# Altium footprint library My Library.PCBLIB: 198 footprints (part 3 of 13)
Each footprint in its own frame and in the unit in brackets; x right, y up, seen from the top. Pads: shape width x height; smd on the part's side, far side on the other; paste and mask are expansions set on the pad; w line width, h text height; cw(c..) or ccw(c..) is an arc to the next point about the centre after c.
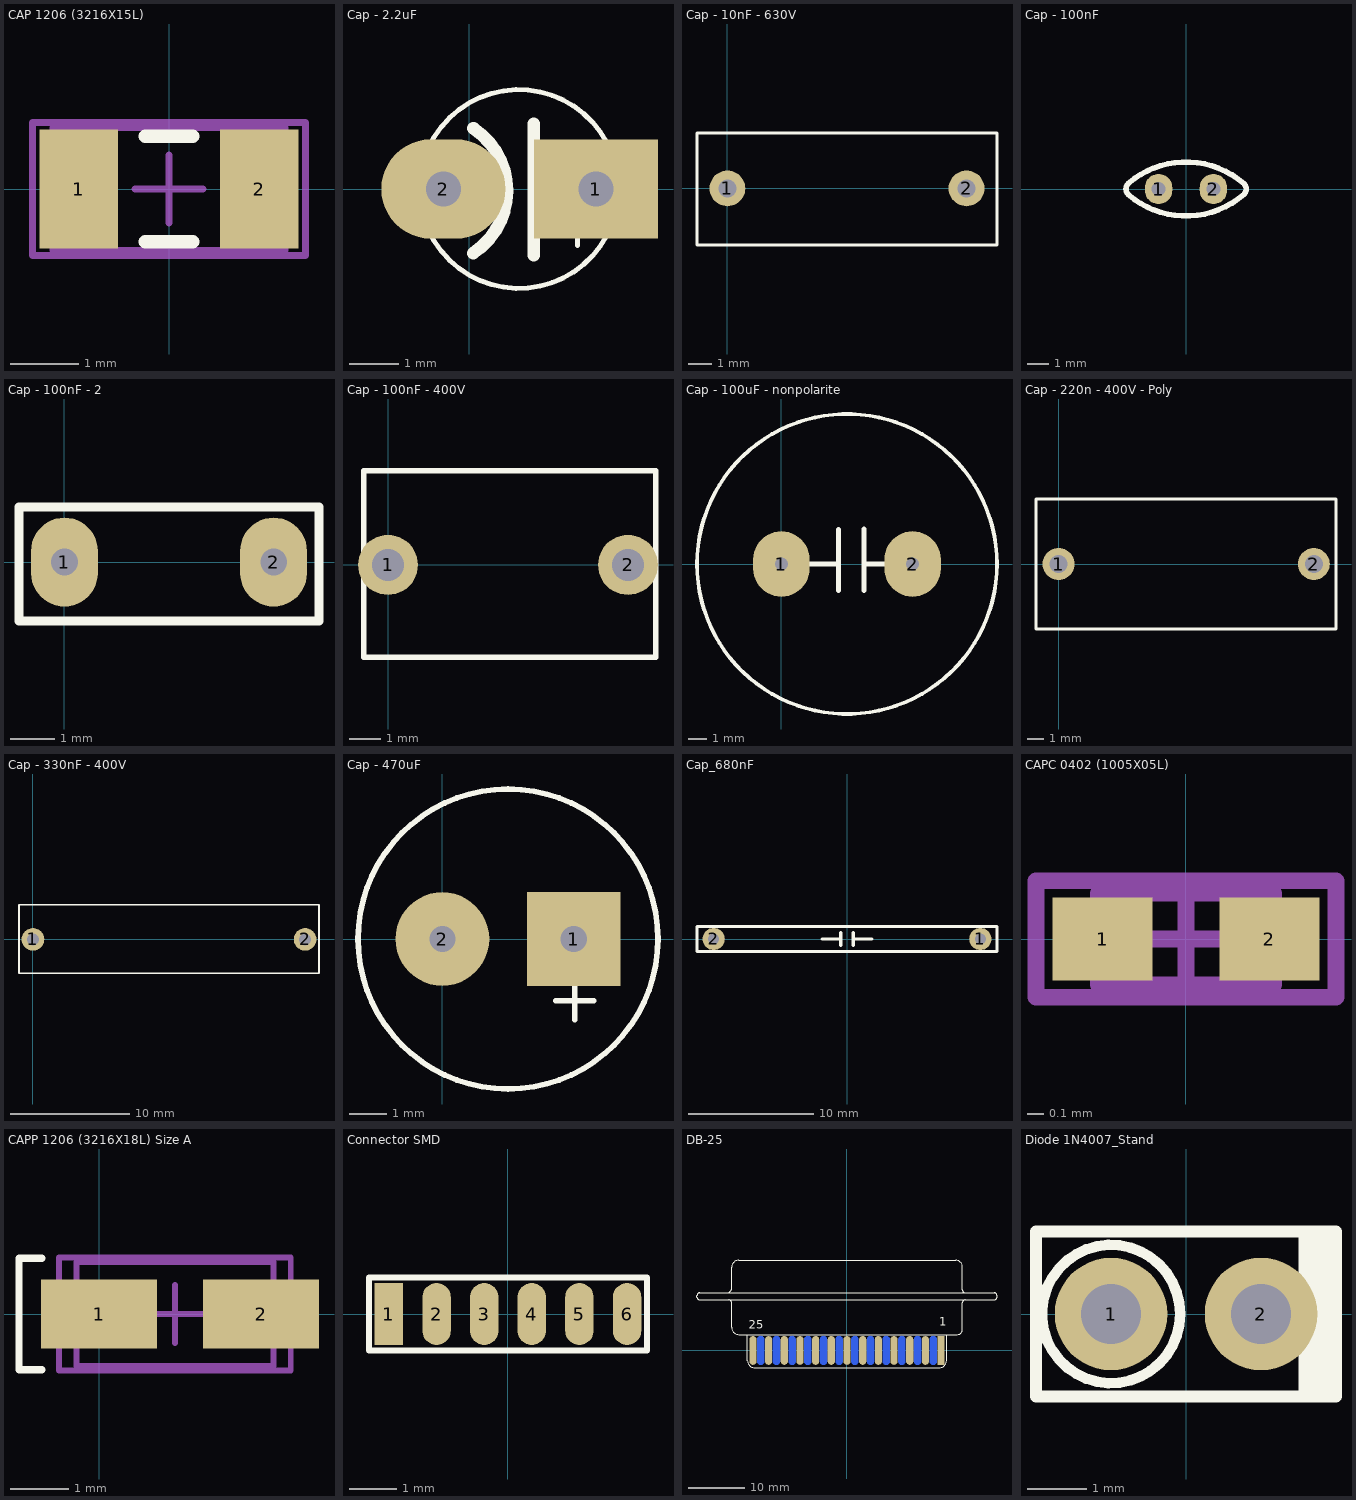
[diagram p2: the footprints below, top view; thin cyan lines are the x and y axes]

## CAP 1206 (3216X15L) [mm] "Chip Capacitor, 2-Leads, Body 3.2x1.6mm, IPC High Density"
height 1.52
pads (2):
  rect 1.15x1.75 smd: 1(-1.325,0) 2(1.325,0)
Top Overlay:
  lines w0.2: -0.35,-0.775 0.35,-0.775 ; -0.35,0.775 0.35,0.775
Mechanical 13:
  lines w0.1: -1.7,-0.9 1.7,-0.9 1.7,0.9 -1.7,0.9 -1.7,-0.9
Mechanical 15:
  lines w0.1: -0.5,0 0.5,0 ; 0,-0.5 0,0.5 ; -2,-0.975 2,-0.975 2,0.975 -2,0.975 -2,-0.975
3D body "1206 cap.STEP": height 1, standoff 0, extent -1.6,-0.8 1.6,0.8

## Cap - 2.2uF [mm]
pads (2):
  rect 2.5x2 hole 0.7: 1(2.55,0)
  oval 2.5x2 hole 0.7: 2(-0.52,0)
Top Overlay:
  circle w0.1: c1,0 r2
  lines w0.1: 1.654,-0.72 2.67,-0.72 ; 2.18,-1.14 2.18,-0.29
  lines w0.254: -0.7,0 0.65,0 ; 0.08,-1.29 ccw(c-0.738,-0.033) 0.088,1.22 ; 1.3,-1.33 1.3,1.31 ; 1.38,0 2.72,0

## Cap - 10nF - 630V [mil]
pads (2):
  round 60 hole 30: 1(0,0) 2(400,0)
Top Overlay:
  lines w5: -50.97,-94.52 -50.97,92.52 451,92.52 451,-94.52 -50.97,-94.52
3D body "Cap 10n - 630V Poly_2009.STEP": height 480, standoff -68.11, extent -50.97,-94.52 451,92.52

## Cap - 100nF [mil]
pads (2):
  oval 50x55 hole 25: 1(-50,0) 2(50,0)
Top Overlay:
  lines w10: -105.81,-9.79 ccw(c0,112.17) 106.05,-9.58 ; -105.81,9.79 cw(c0,-112.17) 106.05,9.58 ; -105.58,-9.52 cw(c-96.06,0) -105.58,9.52 ; 106,-9.52 ccw(c96.48,0) 106,9.52
3D body "Cap 100n.STEP": height 272.48, standoff -39.37, extent -114.93,-34 114.93,32.79

## Cap - 100nF - 2 [mm]
height 5
pads (2):
  oval 1.5x2 hole 0.6: 1(0,0) 2(4.7,0)
Top Overlay:
  lines w0.2: -1.021,-1.328 5.72,-1.328 5.72,1.242 -1.021,1.242 -1.021,-1.328
3D body "cap.STEP": height 6.84, standoff -1.46, extent -0.75,-1.2 5.55,1.2

## Cap - 100nF - 400V [mil]
pads (2):
  round 75 hole 40: 1(0,0) 2(300,0)
Top Overlay:
  lines w7: -30.5,-115.39 334.5,-115.39 334.5,117.65 -30.5,117.65 -30.5,-115.39
3D body "Cap 100n - 400V Poly.STEP": height 460, standoff -88.11, extent -30.5,-115.39 334.5,117.65

## Cap - 100uF - nonpolarite [mm]
pads (2):
  oval 3x3.5 hole 0.7: 1(0,0) 2(7,0)
Top Overlay:
  circle w0.2: c3.5,0 r8
  lines w0.254: 0,0 1.87,0 3.04,0 3.05,-0.01 ; 3.05,-1.43 3.05,1.84 ; 4.41,-1.43 4.41,1.86 4.41,0.1 4.51,0 7,0

## Cap - 220n - 400V - Poly [mil]
pads (2):
  round 75 hole 42: 1(0,0) 2(600,0)
Top Overlay:
  lines w7: -53,-152.52 652,-152.52 652,152.52 -53,152.52 -53,-152.52
3D body "Cap 220n - 400V Poly.STEP": height 508.74, standoff -39.37, extent -53,-152.52 652,152.52

## Cap - 330nF - 400V [mil]
pads (2):
  round 75 hole 40: 1(0,0) 2(900,0)
Top Overlay:
  lines w5: -46.26,-112.21 -46.26,114.21 945.87,114.21 945.87,-112.21 -46.26,-112.21
3D body "Cap 330n - 400V Poly_2009.STEP": height 430, standoff -118.11, extent -18.04,-112.21 917,114.21

## Cap - 470uF [mm]
pads (2):
  rect 2.5x2.5 hole 0.7: 1(3.5,0)
  round 2.5 hole 0.7: 2(0,0)
Top Overlay:
  circle w0.15: c1.75,0 r4
  lines w0.15: 3.022,-1.65 4.038,-1.65 ; 3.53,-2.158 3.53,-1.142

## Cap_680nF [mil]
height 393.7
pads (2):
  round 70 hole 35: 1(420,0) 2(-420,0)
Top Overlay:
  lines w10: -78.74,0 -19.68,0 ; -19.68,-19.68 -19.68,19.68 ; 19.68,-19.68 19.68,19.68 ; 19.68,0 78.74,0 ; -472.44,-39.37 472.44,-39.37 472.44,39.37 -472.44,39.37 -472.44,-39.37
3D body "680nF.STEP": height 497.8, standoff -33.7, extent -472.13,-13.39 472.76,683.32

## CAPC 0402 (1005X05L) [mm] "Chip Capacitor, 2-Leads, Body 1.0x0.5mm, IPC High Density"
height 0.5
pads (2):
  rect 0.6x0.5 smd: 1(-0.5,0) 2(0.5,0)
Mechanical 13:
  lines w0.1: -0.525,-0.275 0.525,-0.275 0.525,0.275 -0.525,0.275 -0.525,-0.275
Mechanical 15:
  lines w0.1: -0.275,0 0.275,0 ; 0,-0.275 0,0.275 ; -0.9,-0.35 0.9,-0.35 0.9,0.35 -0.9,0.35 -0.9,-0.35
3D body: height 0.5, standoff 0, extent -0.525,-0.275 0.525,0.275

## CAPP 1206 (3216X18L) Size A [mil] "Chip Capacitor, 2-Leads, Body 3.2x1.6mm, IPC High Density, chip Tantalum"
height 70.87
pads (2):
  rect 78.7x47.2 smd: 1(0,0) 2(110.22,0)
Top Overlay:
  lines w5: -38.89,-38 -54.39,-38 -54.39,38 -38.89,38
Mechanical 13:
  lines w3.94: -15.32,-35.43 118.54,-35.43 118.54,35.43 -15.32,35.43 -15.32,-35.43
Mechanical 15:
  lines w3.94: 31.92,0 71.29,0 ; 51.61,-19.69 51.61,19.68 ; -27.13,-38.39 -27.13,38.39 130.35,38.39 130.35,-38.39 -27.13,-38.39
3D body "SW3dPS-Solid Tantalum Chip Capacitor Size (A-3216-18).STEP": height 71, standoff 0, extent -16.87,-35.5 126.38,35.5

## Connector SMD [mm]
pads (6):
  rect 0.6x1.3 smd: 1(-2.5,0)
  oval 0.6x1.3 smd: 2(-1.5,0) 3(-0.5,0) 4(0.5,0) 5(1.5,0) 6(2.5,0)
Top Overlay:
  lines w0.127: -2.921,-0.762 -2.921,0.762 2.921,0.762 2.921,-0.762 -2.921,-0.762

## DB-25 [mm] "Connector D25 Male - SMD Design"
pads (25):
  rect 1.27x5.08 smd: 1(16.566,0)
  oval 1.27x5.08 smd: 2(13.805,0) 3(11.044,0) 4(8.283,0) 5(5.522,0) 6(2.761,0) 7(0,0) 8(-2.761,0) 9(-5.522,0) 10(-8.283,0) 11(-11.044,0) 12(-13.805,0) 13(-16.566,0)
  oval 1.27x5.08 smd far side: 14(15.186,0) 15(12.425,0) 16(9.664,0) 17(6.903,0) 18(4.142,0) 19(1.381,0) 20(-1.381,0) 21(-4.142,0) 22(-6.902,0) 23(-9.663,0) 24(-12.424,0) 25(-15.185,0)
Top Overlay:
  lines w0.127: -21.59,10.16 22.86,10.16 ; -21.336,8.89 21.59,8.89 ; -17.526,2.794 -17.526,-1.778 ccw(c-16.256,-1.778) -16.256,-3.048 16.256,-3.048 ccw(c16.256,-1.778) 17.526,-1.778 17.526,2.794 ; -26.416,9.398 ccw(c-25.908,9.398) -25.908,8.89 -20.828,8.89 cw(c-20.828,8.382) -20.32,8.382 -20.32,4.064 ccw(c-19.05,4.064) -19.05,2.794 19.453,2.794 ccw(c19.453,3.661) 20.32,3.661 20.32,8.382 cw(c20.828,8.382) 20.828,8.89 25.908,8.89 ccw(c25.908,9.398) 26.416,9.398 26.416,9.652 ccw(c25.908,9.652) 25.908,10.16 20.828,10.16 cw(c20.828,10.668) 20.32,10.668 20.32,14.732 ccw(c19.177,14.732) 19.177,15.875 -19.05,15.875 ccw(c-19.05,14.605) -20.32,14.605 -20.32,10.922 cw(c-21.082,10.922) -21.082,10.16 -25.908,10.16 ccw(c-25.908,9.652) -26.416,9.652 -26.416,9.398
  text "25" at -17.272,3.81 h1.5
  text "1" at 16.256,4.318 h1.5
3D body "SW3dPS-DB25plug_straight.STEP": height 5.51, standoff -7.04, extent -26.518,-1.422 26.518,15.875

## Diode 1N4007_Stand [mil]
pads (2):
  round 75 hole 40: 1(-50,0) 2(50,0)
Top Overlay:
  circle w7: c-50,0 r46.1
  rectangle: 75,-52 100,53
  lines w7.87: -100,-55 -100,55 100,55 100,-55 -100,-55
3D body "1N4007_Stand.STEP": height 291.09, standoff -39.37, extent -103,-52 65,53